# Altium integrated library PlantiumIntegratedLibrary.IntLib: 638 symbols (part 2 of 6) (continued)
## CC224CKB0402
designator C?  value 220n
220 nF ±10% 10V Ceramic Capacitor X7R 0402 (1005 Metric); Manufacturer Part Number: CGA2B1X7R1A224K050BC; Manufacturer: TDK Corporation; Working Temperature: -55°C ~ 125°C; Short Description: CAP CER 0.22UF 10V X7R 0402; Power: NC; Ratings: REACH, ROHS3, AEC-Q200; Type: MLCC; Temperature Coefficient: X7R; Mounting: SMT; Frequency: NC; Alternate Part Number 1: *; Alternate Part Number 2: *; Tolerance: ±10%; Current: NC; Revision Date: 02/08/21; Package Reference: 0402; Voltage: 10V
footprint C0402
footprint C0402_SMALL
pins: 1, 2

## CC224CKB0402_1
designator C?  value 220n
220 nF ±10% 10V Ceramic Capacitor X7R 0402 (1005 Metric); Manufacturer Part Number: CGA2B1X7R1A224K050BC; Manufacturer: TDK Corporation; Working Temperature: -55°C ~ 125°C; Short Description: CAP CER 0.22UF 10V X7R 0402; Power: NC; Ratings: REACH, ROHS3, AEC-Q200; Type: MLCC; Temperature Coefficient: X7R; Mounting: SMT; Frequency: NC; Alternate Part Number 1: *; Alternate Part Number 2: *; Tolerance: ±10%; Current: NC; Revision Date: 02/08/21; Package Reference: 0402; Voltage: 10V
footprint C0402
footprint C0402_SMALL
pins: 1, 2

## CC333HKB0402
designator C?  value 33n
0.033 µF ±10% 50V Ceramic Capacitor X7R 0402 (1005 Metric); Manufacturer Part Number: GCM155R71H333KE02D; Manufacturer: Murata Electronics; Working Temperature: -55°C ~ 125°C; Short Description: CAP CER 0.033UF 50V X7R 0402; Power: NC; Type: MLCC; Temperature Coefficient: X7R; Mounting: SMT; Ratings: *; Frequency: NC; Alternate Part Number 1: *; Alternate Part Number 2: *; Tolerance: ±10%; Current: NC; Revision Date: 05/05/23; Package Reference: 0402; Voltage: 50V
footprint C0402_SMALL_SMALL (Footprint not found)
pins: 1, 2

## CC475DMC0402W
designator C?  value 4.7u
4.7 µF ±20% 16V Ceramic Capacitor X5R 0402 (1005 Metric); Manufacturer Part Number: 0402YD475MAT2A; Manufacturer: AVX Corporation; Working Temperature: -55°C ~ 85°C; Short Description: CAP CER 4.7UF 16V X5R 0402; Power: NC; Ratings: REACH, ROHS3; Type: MLCC; Temperature Coefficient: X5R; Mounting: SMT; Frequency: NC; Alternate Part Number 1: *; Alternate Part Number 2: *; Tolerance: ±20%; Current: NC; Revision Date: 26/08/21; Package Reference: 0402; Voltage: 16V
footprint C0402 (Footprint not found)
pins: 1, 2

## Ceramico
designator C?
Power: NC; Manufacturer Part Number: *; Working Temperature: *; Temperature Coefficient: *; Mounting: SMT; Short Description: *; Ratings: *; Type: *; Frequency: NC; Alternate Part Number 1: *; Alternate Part Number 2: *; Manufacturer: *; Tolerance: *; Current: NC; Revision Date: 02/08/21; Package Reference: 0402; Voltage: *; Value: *
footprint C0402 (Footprint not found)
pins: 1, 2

## Polarizado
designator C?
Power: NC; Manufacturer Part Number: *; Working Temperature: *; Temperature Coefficient: *; Mounting: SMT; Short Description: *; Ratings: *; Type: *; Frequency: NC; Alternate Part Number 1: *; Alternate Part Number 2: *; Manufacturer: *; Tolerance: *; Current: NC; Revision Date: 02/08/21; Package Reference: 0402; Voltage: *; Value: *
footprint C0402 (Footprint not found)
pins: 1, 2


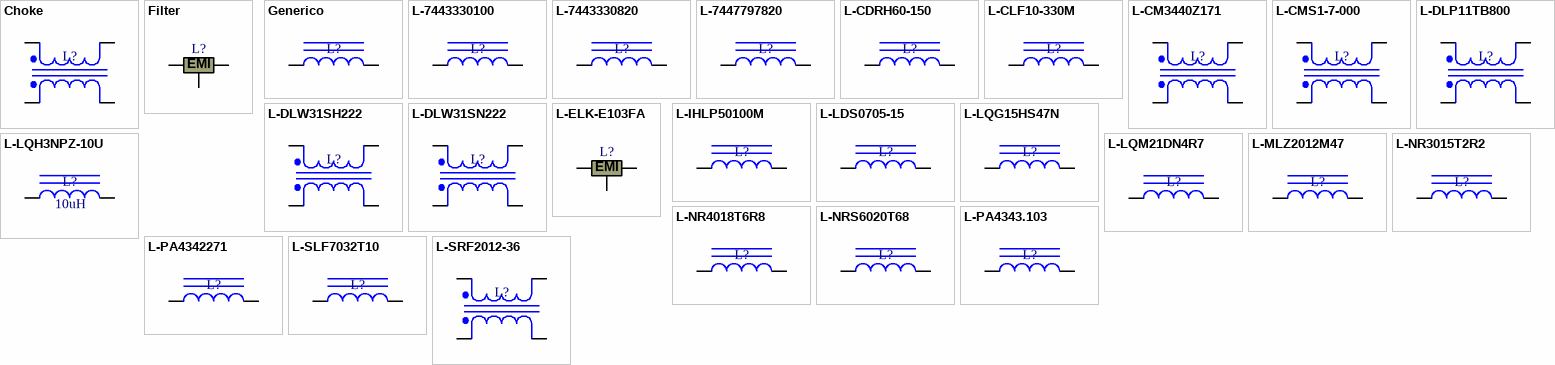
[diagram p10: symbols Choke to L-SRF2012-36]

## Choke
designator L?
Manufacturer Part Number: *; Working Temperature: *; Temperature Coefficient: *; Mounting: *; Short Description: *; Power: *; Ratings: *; Type: *; Frequency: *; Alternate Part Number 1: *; Alternate Part Number 2: *; Manufacturer: *; Tolerance: *; Current: *; Revision Date: *; Package Reference: *; Voltage: *; Value: *
pins: 1, 2, 3, 4

## Filter
designator L?
Manufacturer Part Number: *; Working Temperature: *; Temperature Coefficient: *; Mounting: *; Short Description: *; Power: *; Ratings: *; Type: *; Frequency: *; Alternate Part Number 1: *; Alternate Part Number 2: *; Manufacturer: *; Tolerance: *; Current: *; Revision Date: *; Package Reference: *; Voltage: *; Value: *
pins: 0, 1, 2
text: EMI

## Generico
designator L?
Manufacturer Part Number: *; Working Temperature: *; Temperature Coefficient: *; Mounting: *; Short Description: *; Power: *; Ratings: *; Type: *; Frequency: *; Alternate Part Number 1: *; Alternate Part Number 2: *; Manufacturer: *; Tolerance: *; Current: *; Revision Date: *; Package Reference: *; Voltage: *; Value: *
pins: 1, 2

## L-7443330100
designator L?
1 µH Shielded Wirewound Inductor 20 A 2.65mOhm Max Nonstandard; Manufacturer Part Number: 7443330100; Manufacturer: Würth Elektronik; Working Temperature: -40°C ~ 125°C; Temperature Coefficient: NC; Short Description: FIXED IND 1UH 20A 2.65 MOHM SMD; Ratings: REACH, ROHS3; Type: Fixed; Frequency: 100MHz; Tolerance: ±20%; Current: 20A; Value: 1u; Mounting: SMT; Power: NC; Alternate Part Number 2: *; Revision Date: 03/08/21; Package Reference: *; Voltage: NC
footprint 7443330100 (INDUCTOR POWER (10.90mm x 10.00mm x 9.30mm))
pins: 1, 2

## L-7443330820
designator L?
8.2 µH Shielded Wirewound Inductor 11.5 A 15mOhm Max Nonstandard; Manufacturer Part Number: 7443330820; Manufacturer: Würth Elektronik; Working Temperature: -40°C ~ 125°C; Temperature Coefficient: NC; Short Description: FIXED IND 8.2UH 11.5A 15MOHM SMD; Ratings: REACH, ROHS3; Type: Fixed; Frequency: 36MHz; Tolerance: ±20%; Current: 11.5A; Value: 8.2u; Mounting: SMT; Power: NC; Alternate Part Number 2: *; Revision Date: 03/08/21; Package Reference: *; Voltage: NC
footprint 7443330820
pins: 1, 2

## L-7447797820
designator L?
8.2 µH Shielded Wirewound Inductor 5.05 A 28.6mOhm Max Nonstandard; Manufacturer Part Number: 7447797820; Manufacturer: Würth Elektronik; Working Temperature: -40°C ~ 150°C; Temperature Coefficient: NC; Short Description: FIXED IND 8.2UH 5.05A 28.6 MOHM; Ratings: REACH, ROHS3; Type: Fixed; Frequency: 28MHz; Tolerance: ±20%; Current: 5.05A; Value: 8.2u; Mounting: SMT; Power: NC; Alternate Part Number 2: *; Revision Date: 03/08/21; Package Reference: *; Voltage: NC
footprint 7443330820
pins: 1, 2

## L-CDRH60-150
designator L?
15 µH Shielded - Inductor 2 A 76.8mOhm Nonstandard; Manufacturer Part Number: CDRH60D45BT150NP-150MC; Manufacturer: Sumida America Components Inc.; Working Temperature: -55°C ~ 150°C; Temperature Coefficient: NC; Short Description: FIXED IND 15UH 2A 76.8 MOHM SMD; Type: Fixed; Frequency: ND; Tolerance: ±20%; Current: 2A; Value: 15u; Mounting: SMT; Power: NC; Alternate Part Number 2: *; Revision Date: 25/10/21; Package Reference: *; Voltage: NC
footprint CDRH60D45BT150NP-150MC (Footprint not found)
pins: 1, 2

## L-CLF10-330M
designator L?  (value not drawn)
33 µH Shielded Drum Core, Wirewound Inductor 2.15 A 73.2mOhm Max Nonstandard; Manufacturer Part Number: CLF10060NIT-330M-D; Manufacturer: TDK Corporation; Working Temperature: -55°C ~ 150°C; Temperature Coefficient: NC; Short Description: FIXED IND 33UH 2.9A 73.2 MOHM; Ratings: REACH, ROHS3; Type: Fixed; Frequency: 10MHz; Tolerance: ±20%; Current: 2.15A; Value: 33uH; Mounting: SMT; Power: NC; Alternate Part Number 2: *; Revision Date: 03/08/21; Package Reference: *; Voltage: NC
footprint 7443330100 (INDUCTOR POWER (10.90mm x 10.00mm x 9.30mm))
pins: 1, 2

## L-CM3440Z171
designator L?
2 Line Common Mode Choke Surface Mount 170 Ohms @ 100 MHz 20A DCR 1mOhm; Manufacturer Part Number: CM3440Z171R-10; Manufacturer: Laird-Signal Integrity Products; Working Temperature: -40°C ~ 125°C; Temperature Coefficient: NC; Short Description: CMC 20A 2LN 170 OHM SMD; Ratings: REACH, ROHS3; Mounting: SMT; Power: NC; Type: Choke; Frequency: NC; Alternate Part Number 2: *; Tolerance: NC; Current: 20A; Revision Date: 03/08/21; Package Reference: *; Voltage: NC; Value: 170 Ohms @ 100 MHz
footprint CM3440Z171R-10 ((11.05mm x 8.51mm))
pins: 1, 2, 3, 4

## L-CMS1-7-000
designator L?
41.5 µH @ 100 kHz 2 Line Common Mode Choke Surface Mount 2.6A DCR 19mOhm (Typ); Manufacturer Part Number: CMS1-7-R; Working Temperature: -40°C ~ 160°C; Temperature Coefficient: NC; Short Description: CMC 41.5UH 2.6A 2LN SMD; Ratings: ROHS3; Mounting: SMT; Power: NC; Type: Choke; Frequency: NC; Alternate Part Number 2: *; Manufacturer: CMS1-7-R; Tolerance: NC; Current: 2.6A; Revision Date: 03/08/21; Package Reference: *; Voltage: NC; Value: 41.5 µH @ 100 kHz
footprint CMS1-7
pins: 1, 2, 3, 4

## L-DLP11TB800
designator L?
2 Line Common Mode Choke Surface Mount 80 Ohms @ 100 MHz 100mA DCR 1.88Ohm; Manufacturer Part Number: DLP11TB800UL2L; Manufacturer: Murata Electronics; Working Temperature: -40°C ~ 85°C; Temperature Coefficient: NC; Short Description: CMC 100MA 2LN 80 OHM SMD; Ratings: ROHS3; Mounting: SMT; Power: NC; Type: Choke; Frequency: NC; Alternate Part Number 2: *; Tolerance: NC; Current: 100mA; Revision Date: 03/08/21; Package Reference: 0504; Voltage: NC; Value: 80 Ohms @ 100 MHz
footprint DLP11TB800UL2
pins: 1, 2, 3, 4

## L-DLW31SH222
designator L?
2 Line Common Mode Choke Surface Mount 2.2 kOhms @ 100 MHz 80mA DCR 1.92Ohm; Manufacturer Part Number: DLW31SH222SQ2L; Manufacturer: Murata Electronics; Working Temperature: -40°C ~ 125°C; Temperature Coefficient: NC; Short Description: CMC 80MA 2LN 2.2KOHM SMD AECQ200; Ratings: ROHS3, AEC-Q200; Mounting: SMT; Power: NC; Type: Choke; Frequency: NC; Alternate Part Number 2: *; Tolerance: NC; Current: 80mA; Revision Date: 03/08/21; Package Reference: 1206; Voltage: NC; Value: 2.2 kOhms @ 100 MHz
footprint DLW31SH222SQ2L (Chip Common Mode Choke Coil)
pins: 1, 2, 3, 4

## L-DLW31SN222
designator L?
2 Line Common Mode Choke Surface Mount 2.2 kOhms @ 100 MHz 200mA DCR 1.2Ohm; Manufacturer Part Number: DLW31SN222SQ2L; Manufacturer: Murata Electronics; Working Temperature: -40°C ~ 85°C; Temperature Coefficient: NC; Short Description: CMC 200MA 2LN 2.2KOHM SMD; Ratings: ROHS3; Mounting: SMT; Power: NC; Type: Choke; Frequency: NC; Alternate Part Number 2: *; Tolerance: NC; Current: 200mA; Revision Date: 03/08/21; Package Reference: 1206; Voltage: NC; Value: 2.2 kOhms @ 100 MHz
footprint DLW31SH222SQ2L (Chip Common Mode Choke Coil)
pins: 1, 2, 3, 4

## L-ELK-E103FA
designator L?
LC (T-Type) EMI Filter 3rd Order Low Pass 1 Channel C = 10000pF 2 A 1207 (3218 Metric), 3 PC Pad; Manufacturer Part Number: ELK-E103FA; Manufacturer: Panasonic Electronic Components; Working Temperature: -40°C ~ 85°C; Temperature Coefficient: NC; Short Description: FILTER LC(T) 0.01UF 500KHZ SMD; Ratings: ROHS3; Current: 2A; Value: 500kHz; Mounting: SMT; Power: NC; Type: Filter; Frequency: NC; Alternate Part Number 2: *; Tolerance: NC; Revision Date: 03/08/21; Package Reference: *; Voltage: NC
footprint ELK-E103FA (DIGITAL NOISE FILTER 500KHZ SMD)
pins: 0, 1, 2
text: EMI

## L-IHLP50100M
designator L?  (value not drawn)
10 µH Shielded Molded Inductor 10 A 17.2mOhm Max Nonstandard; Manufacturer Part Number: IHLP50FDER100M01; Manufacturer: Vishay Dale; Working Temperature: -55°C ~ 125°C; Temperature Coefficient: NC; Short Description: FIXED IND 10uH 10A 17.2 MOHM SMD; Ratings: REACH, ROHS3; Type: Fixed; Frequency: 5MHz; Tolerance: ±20%; Current: 10A; Value: 10uH; Mounting: SMT; Power: NC; Alternate Part Number 2: *; Revision Date: 03/08/21; Package Reference: *; Voltage: NC
footprint IHLP5050FDER100M01 (0.520" L x 0.508" W (13.20mm x 12.90mm))
pins: 1, 2

## L-LDS0705-15
designator L?
15 µH Shielded Wirewound Inductor 2.04 A 56mOhm Nonstandard; Manufacturer Part Number: LDS0705-150M-R; Manufacturer: Eaton - Electronics Division; Working Temperature: -40°C ~ 125°C; Temperature Coefficient: NC; Short Description: FIXED IND 15UH 2.04A 56 MOHM SMD; Type: Fixed; Frequency: ND; Tolerance: ±20%; Current: 2.04A; Value: 15u; Mounting: SMT; Power: NC; Alternate Part Number 2: *; Revision Date: 03/08/21; Package Reference: *; Voltage: NC
footprint LDS0705-150M-R
pins: 1, 2

## L-LQG15HS47N
designator L?
47 nH Unshielded Multilayer Inductor 300 mA 720mOhm Max 0402 (1005 Metric); Manufacturer Part Number: LQG15HS47NJ02D; Manufacturer: Murata Electronics; Working Temperature: -55°C ~ 125°C; Temperature Coefficient: NC; Short Description: FIXED IND 47NH 300MA 720MOHM SMD; Ratings: ROHS3; Type: Fixed; Frequency: 1GHz; Tolerance: ±5%; Current: 300mA; Value: 47n; Mounting: SMT; Power: NC; Alternate Part Number 2: *; Revision Date: 03/08/21; Package Reference: 0402; Voltage: NC
footprint L0402
pins: 1, 2

## L-LQH3NPZ-10U
designator L?  value 10uH
10 µH Shielded Drum Core, Wirewound Inductor 1.2 A 288mOhm Max 1212 (3030 Metric); Manufacturer Part Number: LQH3NPZ100MJRL; Manufacturer: Murata Electronics; Working Temperature: -40°C ~ 105°C; Temperature Coefficient: NC; Short Description: FIXED IND 10UH 1.2A 288 MOHM SMD; Ratings: AEC-Q200, ROHS3; Type: Fixed; Frequency: 30MHz; Tolerance: ±20%; Current: 1.2A; Mounting: SMT; Power: NC; Alternate Part Number 2: *; Revision Date: 18/04/23; Package Reference: *; Voltage: NC
footprint NR3015T2R2M
pins: 1, 2

## L-LQM21DN4R7
designator L?
4.7 µH Shielded Multilayer Inductor 30 mA 300mOhm Max 0805 (2012 Metric); Manufacturer Part Number: LQM21DN4R7N00D; Manufacturer: Murata Electronics; Working Temperature: -40°C ~ 85°C; Temperature Coefficient: NC; Short Description: FIXED IND 4.7UH 30MA 300MOHM SMD; Ratings: ROHS3; Type: Fixed; Frequency: 35MHz; Tolerance: ±30%; Current: 30mA; Value: 4.7u; Mounting: SMT; Power: NC; Alternate Part Number 2: *; Revision Date: 03/08/21; Package Reference: 0805; Voltage: NC
footprint LQM21DN4R7N00D
pins: 1, 2

## L-MLZ2012M47
designator L?
47 µH Shielded Multilayer Inductor 170 mA 3.7Ohm 0805 (2012 Metric); Manufacturer Part Number: MLZ2012M470WT000; Manufacturer: TDK Corporation; Working Temperature: -55°C ~ 125°C; Temperature Coefficient: NC; Short Description: FIXED IND 47UH 170MA 3.7 OHM SMD; Ratings: REACH, ROHS3; Type: Fixed; Frequency: 20MHz; Tolerance: ±20%; Current: 170mA; Value: 47u; Mounting: SMT; Power: NC; Alternate Part Number 2: *; Revision Date: 03/08/21; Package Reference: 0805; Voltage: NC
footprint L0805
pins: 1, 2

## L-NR3015T2R2
designator L?
2.2 µH Shielded Wirewound Inductor 1.5 A 72mOhm Max Nonstandard; Manufacturer Part Number: NR3015T2R2M; Manufacturer: Taiyo Yuden; Working Temperature: -25°C ~ 120°C; Temperature Coefficient: NC; Short Description: FIXED IND 2.2UH 1.5A 72 MOHM SMD; Ratings: ROHS3; Type: Fixed; Frequency: 64MHz; Tolerance: ±20%; Current: 1.5A; Value: 2.2u; Mounting: SMT; Power: NC; Alternate Part Number 2: *; Revision Date: 03/08/21; Package Reference: *; Voltage: NC
footprint NR3015T2R2M
pins: 1, 2

## L-NR4018T6R8
designator L?
6.8 µH Shielded Wirewound Inductor 1.06 A 132mOhm Max Nonstandard; Manufacturer Part Number: NR4018T6R8M; Manufacturer: Taiyo Yuden; Working Temperature: -25°C ~ 120°C; Temperature Coefficient: NC; Short Description: FIXED IND 6.8UH 1.06A 132MOHM SM; Ratings: ROHS3; Type: Fixed; Frequency: 29MHz; Tolerance: ±20%; Current: 1.06A; Value: 6.8u; Mounting: SMT; Power: NC; Alternate Part Number 2: *; Revision Date: 03/08/21; Package Reference: *; Voltage: NC
footprint NR4018T6R8M (FIXED IND 6.8UH 1(4.00mm x 4.00mm x 2.00mm))
pins: 1, 2

## L-NRS6020T68
designator L?
6.8 µH Shielded Wirewound Inductor 1.8 A 102mOhm Max Nonstandard; Manufacturer Part Number: NRS6020T6R8NMGJ; Manufacturer: Taiyo Yuden; Working Temperature: -25°C ~ 125°C; Temperature Coefficient: NC; Short Description: FIXED IND 6.8UH 1.8A 102MOHM SMD; Ratings: ROHS3; Type: Fixed; Frequency: 30MHz; Tolerance: ±30%; Current: 1.8A; Value: 6.8u; Mounting: SMT; Power: NC; Alternate Part Number 2: *; Revision Date: 03/08/21; Package Reference: *; Voltage: NC
footprint NRS6020T6R8NMGJ (INDUCTOR 10UH 1.3A 20% SMD)
pins: 1, 2

## L-PA4343.103
designator L?
10 µH Shielded Molded Inductor 11 A 15.8mOhm Max Nonstandard -; Manufacturer Part Number: PA4343.103ANLT; Manufacturer: Pulse Electronics Power; Working Temperature: -55°C ~ 155°C; Temperature Coefficient: NC; Short Description: FIXED IND 10UH 11A 15.8 MOHM SMD; Ratings: REACH, ROHS3, AEC-Q200; Type: Fixed; Frequency: ND; Tolerance: ±20%; Current: 11A; Value: 10u; Mounting: SMT; Power: NC; Alternate Part Number 2: *; Revision Date: 20/09/21; Package Reference: *; Voltage: NC
footprint PA4343.103ANLT (Footprint not found)
pins: 1, 2

## L-PA4342271
designator L?
270nH Shielded Molded Inductor 1mOhm; Manufacturer Part Number: PA4342.271NLT; Manufacturer: Pulse Electronics Power; Working Temperature: -40°C ~ 125°C; Temperature Coefficient: NC; Short Description: FIXED IND 270NH 33A 1 MOHM SMD; Ratings: REACH, ROHS; Type: Fixed; Frequency: 100 kHz; Tolerance: ±20%; Current: 33A; Value: 270n; Mounting: SMT; Power: NC; Alternate Part Number 1: *; Alternate Part Number 2: *; Revision Date: 02/09/21; Package Reference: NC; Voltage: NC
footprint PA4342
pins: 1, 2

## L-SLF7032T10
designator L?
100 µH Shielded Wirewound Inductor 450 mA 540mOhm Max Nonstandard; Manufacturer Part Number: SLF7032T-101MR45-2PF; Manufacturer: TDK Corporation; Working Temperature: -40°C ~ 105°C; Temperature Coefficient: NC; Short Description: FIXED IND 100UH 450MA 540MOHM SM; Ratings: REACH, ROHS3; Type: Fixed; Frequency: ND; Tolerance: ±20%; Current: 450mA; Value: 100u; Mounting: SMT; Power: NC; Alternate Part Number 2: *; Revision Date: 03/08/21; Package Reference: *; Voltage: NC
footprint SLF7032T-101MR45-2-PF
pins: 1, 2

## L-SRF2012-36
designator L?
2 Line Common Mode Choke Surface Mount 360 Ohms @ 100 MHz 300mA DCR 450mOhm; Manufacturer Part Number: SRF2012-361YA; Manufacturer: Bourns Inc.; Working Temperature: -40°C ~ 125°C; Temperature Coefficient: NC; Short Description: CMC 300MA 2LN 360 OHM SMD; Ratings: REACH, ROHS3; Mounting: SMT; Power: NC; Type: Choke; Frequency: NC; Alternate Part Number 2: *; Tolerance: NC; Current: 300mA; Revision Date: 03/08/21; Package Reference: *; Voltage: NC; Value: 360 Ohms @ 100 MHz
footprint SRF2012-361 (CHOKE COMM MODE 90 OHM .4A SMD)
pins: 1, 2, 3, 4


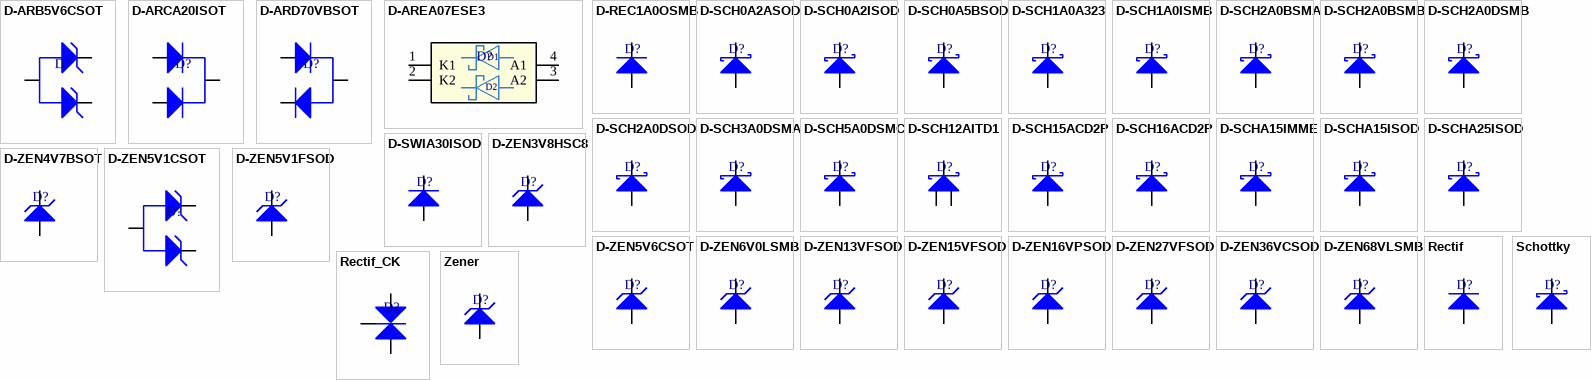
[diagram p11: symbols D-ARB5V6CSOT to Zener]

## D-ARB5V6CSOT
designator D?
Zener Diode Array 1 Pair Common Anode 5.6 V 300 mW ±2% TO-236AB; Manufacturer Part Number: BZB84-B5V6,215; Manufacturer: Nexperia USA Inc.; Working Temperature: -55°C ~ 150°C (TA); Temperature Coefficient: NC; Short Description: DIODE ZENER ARRAY 5.6V SOT23; Power: 300mW; Ratings: REACH, ROHS3; Current: 1 µA @ 2 V; Voltage: 900 mV @ 10 mA; Value: 5.6; Mounting: SMT; Type: Zener; Frequency: NC; Alternate Part Number 2: *; Tolerance: ±2%; Revision Date: 03/08/21; Package Reference: SOT-23-3
footprint SOT-23-3
pins: 1 K, 2 K, 3 A

## D-ARCA20ISOT
designator D?
Diode Array 1 Pair Common Cathode Standard 100 V 215mA (DC) Surface Mount TO-236-3, SC-59, SOT-23-3; Manufacturer Part Number: BAV70; Manufacturer: Rectron USA; Working Temperature: -55°C ~ 150°C; Temperature Coefficient: NC; Short Description: DUAL SWITCHING DIODE COM CATHOD; Ratings: ROHS3; Type: Rectifier; Voltage: 100V; Value: NC; Mounting: SMT; Power: NC; Frequency: NC; Alternate Part Number 2: *; Tolerance: NC; Current: 215mA; Revision Date: 03/08/21; Package Reference: SOT-23-3
footprint SOT-23-3
pins: 1 A, 2 A, 3 K

## D-ARD70VBSOT
designator D?
Diode Array 1 Pair Series Connection 70 V 215mA (DC) Surface Mount TO-236-3, SC-59, SOT-23-3; Manufacturer Part Number: BAV199LT1G; Alternate Part Number 2: CADA DIODO; Manufacturer: onsemi; Working Temperature: -65°C ~ 150°C; Temperature Coefficient: NC; Short Description: DIODE ARRAY GP 70V 215MA SOT23-3; Power: 225mW; Ratings: ROHS3; Voltage: 70V; Value: NC; Mounting: SMT; Type: NC; Frequency: NC; Tolerance: NC; Current: 215mA; Revision Date: 23/04/23; Package Reference: SOT-23-3
footprint SOT-23-3
pins: 1 A, 2 K, 3 C

## D-AREA07ESE3
designator D?, comment BAS70-07,215  (value not drawn)
Diode Array 2 Independent Schottky 70 V 70mA (DC) Surface Mount TO-253-4, TO-253AA; Manufacturer: Nexperia USA Inc.; Frequency: NC; Short Description: DIODE ARRAY SCHOTTKY 70V SOT143B; Ratings: ROHS3; Type: SCH; Working Temperature: 150°C (Max); Voltage: 70 V; Value: NC; Manufacturer Part Number: BAS70-07,215; Temperature Coefficient: NC; Mounting: SMT; Power: NC; Alternate Part Number 1: *; Alternate Part Number 2: *; Tolerance: NC; Current: 70 mA; Revision Date: 30/09/22; Package Reference: TO-253-4, TO-253AA
footprint SOT143B_NXP
footprint SOT143B_NXP-L
footprint SOT143B_NXP-M
pins: 1 K1, 2 K2, 3 A2, 4 A1
text: D1; D2

## D-REC1A0OSMB
designator D?
Diode Standard 400 V 1A Surface Mount SMB; Manufacturer Part Number: S1GB-13-F; Manufacturer: Diodes Incorporated; Working Temperature: -65°C ~ 150°C; Temperature Coefficient: NC; Short Description: DIODE GEN PURP 400V 1A SMB; Ratings: REACH, ROHS3; Type: Rectifier; Voltage: 400V; Value: NC; Mounting: SMT; Power: NC; Frequency: NC; Alternate Part Number 1: *; Alternate Part Number 2: *; Tolerance: NC; Current: 1A; Revision Date: 03/08/21; Package Reference: DO-214AA
footprint DO-214AA
pins: 1 K, 2 A

## D-SCH0A2ASOD
designator D?
Diode Schottky 30 V 200mA (DC) Surface Mount SOD-123; Manufacturer Part Number: BAT43W-HE3-08; Manufacturer: Vishay; Frequency: NC; Short Description: DIODE SCHOTTKY 30V 200MA SOD123; Power: 200mW; Ratings: REACH, ROHS3; Type: SCH; Working Temperature: 125°C (Max); Voltage: 30V; Value: NC; Temperature Coefficient: NC; Mounting: SMT; Alternate Part Number 1: *; Alternate Part Number 2: *; Tolerance: NC; Current: 200mA; Revision Date: 24/11/21; Package Reference: SOD-123
footprint SOD-123
pins: 1 K, 2 A

## D-SCH0A2ISOD
designator D?
Diode Schottky 100 V 200mA (DC) Surface Mount SOD-123; Manufacturer Part Number: BAT41ZFILM; Manufacturer: STMicroelectronics; Working Temperature: 150°C (Max); Temperature Coefficient: NC; Short Description: DIODE SCHOTTKY 100V 200MA SOD123; Ratings: REACH, ROHS3; Type: SCH; Voltage: 100V; Value: NC; Mounting: SMT; Power: NC; Frequency: NC; Alternate Part Number 2: *; Tolerance: NC; Current: 200mA; Revision Date: 03/08/21; Package Reference: SOD-123
footprint SOD-123
pins: 1 K, 2 A

## D-SCH0A5BSOD
designator D?
Diode Schottky 40 V 500mA Surface Mount SOD-123; Manufacturer Part Number: MBR0540T1G; Manufacturer: ON Semiconductor; Working Temperature: -55°C ~ 150°C; Temperature Coefficient: NC; Short Description: DIODE SCHOTTKY 40V 500MA SOD123; Ratings: REACH, ROHS3; Type: SCH; Voltage: 40V; Value: NC; Mounting: SMT; Power: NC; Frequency: NC; Alternate Part Number 2: *; Tolerance: NC; Current: 500mA; Revision Date: 03/08/21; Package Reference: SOD-123
footprint SOD-123
pins: 1 K, 2 A

## D-SCH1A0A323
designator D?
Diode Schottky 30 V 1A Surface Mount USC; Manufacturer Part Number: CUS10S30,H3F; Manufacturer: Toshiba Semiconductor and Storage; Working Temperature: 125°C (Max); Temperature Coefficient: NC; Short Description: DIODE SCHOTTKY 30V 1A USC; Ratings: ROHS3; Type: SCH; Voltage: 30V; Value: NC; Mounting: SMT; Power: NC; Frequency: NC; Alternate Part Number 2: *; Tolerance: NC; Current: 1A; Revision Date: 03/08/21; Package Reference: SOD-323
footprint SOD-323
pins: 1 K, 2 A

## D-SCH1A0ISMB
designator D?
Diode Schottky 100 V 1A Surface Mount DO-214AC (SMA); Manufacturer Part Number: VS-10MQ100NTRPBF; Manufacturer: Vishay General Semiconductor - Diodes Division; Working Temperature: -55°C ~ 150°C; Temperature Coefficient: NC; Short Description: DIODE SCHOTTKY 100V 1A SMA; Ratings: REACH, ROHS3; Type: SCH; Voltage: 100V; Value: NC; Mounting: SMT; Power: NC; Frequency: NC; Alternate Part Number 2: *; Tolerance: NC; Current: 1A; Revision Date: 03/08/21; Package Reference: DO-214AC
footprint DO-214AC-SMALL (Manufacturer: Vishay)
pins: 1 K, 2 A

## D-SCH2A0BSMA
designator D?
Diode Schottky 2A Surface Mount DO-214AC (SMA); Manufacturer Part Number: CD214A-B240LLF; Manufacturer: Bourns Inc.; Working Temperature: -55°C ~ 125°C; Temperature Coefficient: NC; Short Description: DIODE SCHOTTKY 40V 2A SMA; Ratings: REACH, ROHS3; Type: SCH; Voltage: 40V; Value: NC; Mounting: SMT; Power: NC; Frequency: NC; Alternate Part Number 2: *; Tolerance: NC; Current: 2A; Revision Date: 03/08/21; Package Reference: DO-214AC
footprint DO-214AC-BIG (Manufacturer: BOURNS)
pins: 1 K, 2 A

## D-SCH2A0BSMB
designator D?
Diode Schottky 40 V 2A Surface Mount SMB; Manufacturer Part Number: STPS2L40U; Manufacturer: STMicroelectronics; Working Temperature: 150°C (Max); Temperature Coefficient: NC; Short Description: DIODE SCHOTTKY 40V 2A SMB; Ratings: REACH, ROHS3; Type: SCH; Voltage: 40V; Value: NC; Mounting: SMT; Power: NC; Frequency: NC; Alternate Part Number 2: *; Tolerance: NC; Current: 2A; Revision Date: 03/08/21; Package Reference: DO-214AA
footprint DO-214AA
pins: 1 K, 2 A

## D-SCH2A0DSMB
designator D?
Diode Schottky 60 V 2A Surface Mount SMBflat; Manufacturer Part Number: STPS2L60UF; Manufacturer: STMicroelectronics; Working Temperature: 150°C (Max); Temperature Coefficient: NC; Short Description: DIODE SCHOTTKY 60V 2A SMBFLAT; Ratings: REACH, ROHS3; Type: SCH; Voltage: 60V; Value: NC; Mounting: SMT; Power: NC; Frequency: NC; Alternate Part Number 2: *; Tolerance: NC; Current: 2A; Revision Date: 03/08/21; Package Reference: DO-221AA
footprint DO-221AA
pins: 1 K, 2 A

## D-SCH2A0DSOD
designator D?
Diode Schottky 60 V 2A Surface Mount PMDU; Manufacturer Part Number: RB060M-60TR; Manufacturer: Rohm Semiconductor; Working Temperature: 150°C (Max); Temperature Coefficient: NC; Short Description: DIODE SCHOTTKY 60V 2A PMDU; Ratings: ROHS3; Type: SCH; Voltage: 60V; Value: NC; Mounting: SMT; Power: NC; Frequency: NC; Alternate Part Number 2: *; Tolerance: NC; Current: 2A; Revision Date: 03/08/21; Package Reference: SOD-123F
footprint SOD-123F
pins: 1 K, 2 A

## D-SCH3A0DSMA
designator D?  (value not drawn)
Diode Schottky 60 V 3A Surface Mount SMA; Manufacturer Part Number: B360A-13-F; Manufacturer: Diodes Incorporated; Working Temperature: -55°C ~ 150°C; Temperature Coefficient: NC; Short Description: DIODE SCHOTTKY 60V 3A SMA; Ratings: REACH, ROHS3; Type: SCH; Voltage: 60V; Value: NC; Mounting: SMT; Power: NC; Frequency: NC; Alternate Part Number 2: *; Tolerance: NC; Current: 3A; Revision Date: 03/08/21; Package Reference: DO-214AC
footprint DO-214AC-BIG (Manufacturer: BOURNS)
pins: 1 K, 2 A

## D-SCH5A0DSMC
designator D?
Diode Schottky 60 V 5A Surface Mount SMC; Manufacturer Part Number: B560C-13-F; Manufacturer: Diodes Incorporated; Working Temperature: -55°C ~ 150°C; Temperature Coefficient: NC; Short Description: DIODE SCHOTTKY 60V 5A SMC; Ratings: ROHS3; Type: SCH; Voltage: 60V; Value: NC; Mounting: SMT; Power: NC; Frequency: NC; Alternate Part Number 2: *; Tolerance: NC; Current: 5A; Revision Date: 03/08/21; Package Reference: DO-214AB
footprint DO-214AB
pins: 1 K, 2 A

## D-SCH12AITD1
designator D?
Diode Schottky 100 V 12A Surface Mount TO-277-3; Manufacturer Part Number: FSV12100V; Manufacturer: onsemi; Working Temperature: -55°C ~ 150°C; Temperature Coefficient: NC; Short Description: DIODE SCHOTTKY 100V 12A TO277-3; Ratings: REACH, ROHS3; Type: SCH; Voltage: 100V; Value: NC; Mounting: SMT; Power: NC; Frequency: NC; Alternate Part Number 2: *; Tolerance: NC; Current: 12A; Revision Date: 20/09/21; Package Reference: TO277-3
footprint TO-227-3
pins: 1 A1, 2 A2, 3 K

## D-SCH15ACD2P
designator D?  (value not drawn)
Diode 30 V 15A Surface Mount DDPAK/TO-263-3; Manufacturer Part Number: SM74611KTTR; Manufacturer: Texas Instruments; Working Temperature: -65°C ~ 175°C; Temperature Coefficient: NC; Short Description: DIODE GP 30V 15A DDPAK/TO-263-3; Ratings: REACH, ROHS3; Type: SCH; Voltage: 30V; Vf: 26mV@8A; Mounting: SMT; Power: NC; Frequency: NC; Alternate Part Number 2: *; Tolerance: NC; Current: 15A; Revision Date: 20/09/21; Package Reference: TO-263-3, D²Pak (2 Leads + Tab), TO-263AB
footprint D2PAK (D2-PAK/TO-263-AB; 3 Leads (1 Cropped); Body 15.5 (inc. leads) x 10.5 mm (LxW max))
pins: 1 A2, 2 K, 3 A1

## D-SCH16ACD2P
designator D?  (value not drawn)
Diode Schottky 45 V 16A Surface Mount D²PAK; Manufacturer Part Number: MBRB1645T4G; Manufacturer: onsemi; Working Temperature: -65°C ~ 175°C; Temperature Coefficient: NC; Short Description: DIODE SCHOTTKY 45V 16A D2PAK; Ratings: REACH, ROHS3; Type: SCH; Voltage: 45V; Value: NC; Mounting: SMT; Power: NC; Frequency: NC; Alternate Part Number 2: *; Tolerance: NC; Current: 16a; Revision Date: 20/09/21; Package Reference: TO-263-3, D²Pak (2 Leads + Tab), TO-263AB
footprint D2PAK (D2-PAK/TO-263-AB; 3 Leads (1 Cropped); Body 15.5 (inc. leads) x 10.5 mm (LxW max))
pins: 1 A2, 2 K, 3 A1

## D-SCHA15IMME
designator D?
Diode Schottky 100 V 150mA (DC) Surface Mount Mini MELF; Manufacturer Part Number: TMMBAT46FILM; Manufacturer: STMicroelectronics; Working Temperature: -65°C ~ 125°C; Temperature Coefficient: NC; Short Description: DIODE SCHOTTKY 100V 150MA MINMLF; Ratings: REACH, ROHS3; Type: SCH; Voltage: 100V; Value: NC; Mounting: SMT; Power: NC; Frequency: NC; Alternate Part Number 2: *; Tolerance: NC; Current: 150mA; Revision Date: 03/08/21; Package Reference: DO-213AA
footprint DO-213AA
pins: 1 K, 2 A

## D-SCHA15ISOD
designator D?
Diode Schottky 100 V 150mA (DC) Surface Mount SOD-123; Manufacturer Part Number: BAT46ZFILM; Manufacturer: STMicroelectronics; Working Temperature: -65°C ~ 125°C; Temperature Coefficient: NC; Short Description: DIODE SCHOTTKY 100V 150MA SOD123; Ratings: REACH, ROHS3; Type: SCH; Voltage: 100V; Value: NC; Mounting: SMT; Power: NC; Frequency: NC; Alternate Part Number 2: *; Tolerance: NC; Current: 150mA; Revision Date: 23/08/21; Package Reference: SOD-123
footprint SOD-123
pins: 1 K, 2 A

## D-SCHA25ISOD
designator D?
Diode Schottky 100 V 250mA Surface Mount SOD-123; Manufacturer Part Number: BAT46GWJ; Manufacturer: Nexperia USA Inc.; Working Temperature: -55°C ~ 150°C; Temperature Coefficient: NC; Short Description: DIODE SCHOTTKY 100V 250MA SOD123; Ratings: REACH, ROHS3, AEC-Q101; Type: SCH; Voltage: 100V; Value: NC; Mounting: SMT; Power: NC; Frequency: NC; Alternate Part Number 1: *; Alternate Part Number 2: *; Tolerance: NC; Current: 250mA; Revision Date: 14/06/23; Package Reference: SOD-123; ComponentLink1Description: Datasheet; ComponentLink1URL: https://assets.nexperia.com/documents/data-sheet/BAT46GW.pdf
footprint SOD-123
pins: 1 K, 2 A

## D-SWIA30ISOD
designator D?
Diode Standard 100 V 150mA Surface Mount SOD-123; Manufacturer Part Number: 1N4148W-7-F; Manufacturer: Diodes Incorporated; Working Temperature: -65°C ~ 150°C; Temperature Coefficient: NC; Short Description: DIODE GEN PURP 100V 150MA SOD123; Ratings: REACH, ROHS3; Type: Rectifier; Voltage: 100V; Value: NC; Mounting: SMT; Power: NC; Frequency: NC; Alternate Part Number 2: *; Tolerance: NC; Current: 150mA; Revision Date: 03/08/21; Package Reference: SOD-123
footprint SOD-123
pins: 1 K, 2 A

## D-ZEN3V8HSC8
designator D?
Zener Diode 3.8 V 1 W ±5.26% Surface Mount PMDTM; Manufacturer Part Number: PDZVTR3.6B; Manufacturer: Rohm Semiconductor; Frequency: NC; Short Description: DIODE ZENER 3.8V 1W PMDTM; Power: 1W; Ratings: ROHS3; Working Temperature: 150°C (TJ); Current: ND; Voltage: 750mV @ 20mA; Value: 3.8V; Temperature Coefficient: NC; Mounting: SMT; Type: Zener; Alternate Part Number 1: *; Alternate Part Number 2: *; Tolerance: ±5.26%; Revision Date: 02/09/21; Package Reference: SOD-128
footprint SOD-128
pins: 1 K, 2 A

## D-ZEN4V7BSOT
designator D?
Zener Diode 4.7 V 225 mW ±6% Surface Mount SOT-23-3 (TO-236); Manufacturer Part Number: BZX84C4V7LT1G; Manufacturer: onsemi; Short Description: DIODE ZENER 4.7V 250MW SOT23-3; Power: 250 mW; Ratings: ROHS3, REACH, EAR99; Working Temperature: -65°C ~ 150°C (TJ); Current: 3 µA @ 2 V; Voltage: 900 mV @ 10 mA; Value: 4.7 V; Frequency: *; Temperature Coefficient: *; Mounting: SMD; Type: Zener; Alternate Part Number 1: *; Alternate Part Number 2: *; Tolerance: ±6%; Revision Date: 23/06/2023; Package Reference: SOT-23-3; ComponentLink1Description: Datasheet; ComponentLink1URL: https://www.onsemi.com/pdf/datasheet/bzx84c2v4lt1-d.pdf
footprint SOT-23-3
pins: 1 A, 3 K

## D-ZEN5V1CSOT
designator D?
Zener Diode Array 1 Pair Common Anode 5.1 V 300 mW ±2% TO-236AB; Manufacturer Part Number: BZB84-B5V1,215; Manufacturer: Nexperia USA Inc.; Working Temperature: ND; Temperature Coefficient: NC; Short Description: DIODE ZENER ARRAY 5.1V SOT23; Power: 300mW; Ratings: REACH, ROHS3; Current: 2 µA @ 2 V; Voltage: 900 mV @ 10 mA; Value: 5.1; Mounting: SMT; Type: Zener; Frequency: NC; Alternate Part Number 2: *; Tolerance: ±2%; Revision Date: 03/08/21; Package Reference: SOT-23-3
footprint SOT-23-3
pins: 1 K, 2 K, 3 A

## D-ZEN5V1FSOD
designator D?
Zener Diode 5.1 V 500 mW ±5% Surface Mount SOD-123; Manufacturer Part Number: MMSZ5231B-7-F; Manufacturer: Diodes Incorporated; Working Temperature: -65°C ~ 150°C; Temperature Coefficient: NC; Short Description: DIODE ZENER 5.1V 500MW SOD123; Power: 500mW; Ratings: REACH, ROHS3; Current: 5 µA @ 2 V; Voltage: 900 mV @ 10 mA; Value: 5.1; Mounting: SMT; Type: Zener; Frequency: NC; Alternate Part Number 2: *; Tolerance: ±5%; Revision Date: 15/03/22; Package Reference: SOD-123
footprint SOD-123
pins: 1 K, 2 A

## D-ZEN5V6CSOT
designator D?
Zener Diode 5.6 V 350 mW ±7% Surface Mount SOT-23-3; Manufacturer Part Number: BZX84C5V6; Manufacturer: ON Semiconductor; Working Temperature: -55°C ~ 150°C; Temperature Coefficient: NC; Short Description: DIODE ZENER 5.6V 350MW SOT23-3; Power: 350mW; Ratings: REACH; Current: 1 µA @ 2 V; Voltage: 900 mV @ 10 mA; Value: 5.6; Mounting: SMT; Type: Zener; Frequency: NC; Alternate Part Number 2: *; Tolerance: ±7%; Revision Date: 03/08/21; Package Reference: SOT-23-3
footprint SOT-23-3
pins: 1 A, 3 K

## D-ZEN6V0LSMB
designator D?  (value not drawn)
Zener Diode 6 V 5 W ±5% Surface Mount DO-214AA (SMB); Manufacturer Part Number: CZRB5340B-HF; Manufacturer: Comchip Technology; Working Temperature: -55°C ~ 150°C; Temperature Coefficient: NC; Short Description: DIODE ZENER 6V 5W DO214AA; Power: 5 W; Ratings: REACH, ROHS3; Current: 1 µA @ 3 V; Voltage: 1.2 V @ 200 mA; Value: 6 V; Mounting: SMT; Type: Zener; Frequency: NC; Alternate Part Number 2: *; Tolerance: ±5%; Revision Date: 03/08/21; Package Reference: DO-214AA
footprint DO-214AA
pins: 1 K, 2 A

## D-ZEN13VFSOD
designator D?
Zener Diode 13 V 500 mW ±6% Surface Mount SOD-123; Manufacturer Part Number: MMSZ13T1G; Manufacturer: onsemi; Working Temperature: -55°C ~ 150°C; Temperature Coefficient: NC; Short Description: DIODE ZENER 13V 500MW SOD123; Power: 500mW; Ratings: REACH, ROHS3; Current: 100 nA @ 10.5 V; Voltage: 900 mV @ 10 mA; Value: 13; Mounting: SMT; Type: Zener; Frequency: NC; Alternate Part Number 2: *; Tolerance: ±6%; Revision Date: 04/08/22; Package Reference: SOD-123
footprint SOD-123
pins: 1 K, 2 A

## D-ZEN15VFSOD
designator D?
Zener Diode 15 V 500 mW ±6% Surface Mount SOD-123; Manufacturer Part Number: BZT52C15-7-F; Manufacturer: Diodes Incorporated; Working Temperature: -65°C ~ 150°C; Temperature Coefficient: NC; Short Description: DIODE ZENER 15V 500MW SOD123; Power: 500mW; Ratings: REACH, ROHS3; Current: 100 nA @ 10.5 V; Voltage: 900 mV @ 10 mA; Value: 15; Mounting: SMT; Type: Zener; Frequency: NC; Alternate Part Number 2: *; Tolerance: ±6%; Revision Date: 03/08/21; Package Reference: SOD-123
footprint SOD-123
pins: 1 K, 2 A

## D-ZEN16VPSOD
designator D?
Zener Diode 16 V 590 mW ±1.88% Surface Mount SOD-123; Manufacturer Part Number: BZT52-B16J; Manufacturer: Nexperia USA Inc.; Working Temperature: -55°C ~ 150°C (TA); Temperature Coefficient: NC; Short Description: DIODE ZENER 16V 590MW SOD123; Power: 590mW; Ratings: REACH, ROHS3; Current: 50 nA @ 11.2 V; Voltage: 900 mV @ 10 mA; Value: 16; Mounting: SMT; Type: Zener; Frequency: NC; Alternate Part Number 2: *; Tolerance: ±1.88%; Revision Date: 03/08/21; Package Reference: SOD-123
footprint SOD-123
pins: 1 K, 2 A

## D-ZEN27VFSOD
designator D?
Zener Diode 27 V 500 mW ±5% Surface Mount SOD-123; Manufacturer Part Number: MMSZ4711T1G; Manufacturer: onsemi; Working Temperature: -55°C ~ 150°C; Temperature Coefficient: NC; Short Description: DIODE ZENER 27V 500MW SOD123; Power: 500mW; Ratings: REACH, ROHS3; Tolerance: ±6%; Current: 10 nA @ 20.4 V; Voltage: 900 mV @ 10 mA; Value: 27; Mounting: SMT; Type: Zener; Frequency: NC; Alternate Part Number 2: *; Revision Date: 04/08/22; Package Reference: SOD-123
footprint SOD-123
pins: 1 K, 2 A

## D-ZEN36VCSOD
designator D?
Zener Diode 36 V 310 mW ±2.5% Surface Mount SOD-123; Manufacturer Part Number: DDZ36-7; Manufacturer: Diodes Incorporated; Working Temperature: -65°C ~ 150°C; Temperature Coefficient: NC; Short Description: DIODE ZENER 36V 310MW SOD123; Power: 310mW; Ratings: REACH, ROHS3; Current: 50 nA @ 30 V; Voltage: 900 mV @ 10 mA; Value: 36; Mounting: SMT; Type: Zener; Frequency: NC; Alternate Part Number 2: *; Tolerance: ±2.5%; Revision Date: 03/08/21; Package Reference: SOD-123
footprint SOD-123
pins: 1 K, 2 A

## D-ZEN68VLSMB
designator D?
Zener Diode 68 V 3 W ±5% Surface Mount SMB; Manufacturer Part Number: 1SMB5945BT3G; Manufacturer: ON Semiconductor; Working Temperature: -65°C ~ 150°C; Temperature Coefficient: NC; Short Description: DIODE ZENER 68V 3W SMB; Power: 3W; Ratings: REACH, ROHS3; Current: 1 µA @ 51.7 V; Voltage: 1.5 V @ 200 mA; Value: 68; Mounting: SMT; Type: Zener; Frequency: NC; Alternate Part Number 2: *; Tolerance: ±5%; Revision Date: 03/08/21; Package Reference: DO-214AA
footprint DO-214AA
pins: 1 K, 2 A

## Rectif
designator D?
Manufacturer Part Number: *; Frequency: *; Temperature Coefficient: *; Mounting: *; Short Description: *; Power: *; Ratings: *; Type: *; Working Temperature: *; Alternate Part Number 1: *; Alternate Part Number 2: *; Manufacturer: *; Tolerance: *; Current: *; Revision Date: *; Package Reference: *; Voltage: *; Value: *
pins: 1 K, 2 A

## Rectif_CK
designator D?
Manufacturer Part Number: *; Frequency: *; Temperature Coefficient: *; Mounting: *; Short Description: *; Power: *; Ratings: *; Type: *; Working Temperature: *; Alternate Part Number 1: *; Alternate Part Number 2: *; Manufacturer: *; Tolerance: *; Current: *; Revision Date: *; Package Reference: *; Voltage: *; Value: *
pins: 1 A, 2 A, 3 K

## Schottky
designator D?
Manufacturer Part Number: *; Frequency: *; Temperature Coefficient: *; Mounting: *; Short Description: *; Power: *; Ratings: *; Type: *; Working Temperature: *; Alternate Part Number 1: *; Alternate Part Number 2: *; Manufacturer: *; Tolerance: *; Current: *; Revision Date: *; Package Reference: *; Voltage: *; Value: *
pins: 1 K, 2 A

## Zener
designator D?
Manufacturer Part Number: *; Frequency: *; Temperature Coefficient: *; Mounting: *; Short Description: *; Power: *; Ratings: *; Type: *; Working Temperature: *; Alternate Part Number 1: *; Alternate Part Number 2: *; Manufacturer: *; Tolerance: *; Current: *; Revision Date: *; Package Reference: *; Voltage: *; Value: *
pins: 1 K, 2 A


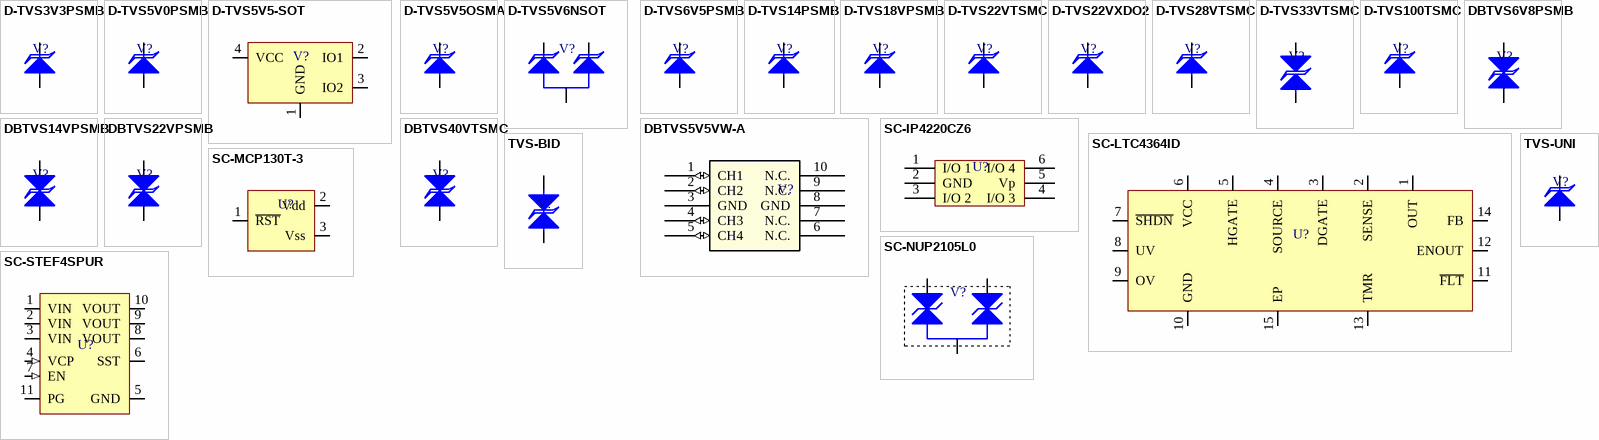
[diagram p12: symbols D-TVS3V3PSMB to TVS-UNI]

## D-TVS3V3PSMB
designator V?
10.3V Clamp 200A (8/20µs) Ipp Tvs Diode Surface Mount SMB (DO-214AA); Manufacturer Part Number: SMLVT3V3; Manufacturer: STMicroelectronics; Working Temperature: -25°C ~ 175°C (TJ); Temperature Coefficient: NC; Short Description: TVS DIODE 3.3VWM 10.3VC SMB; Power: 600W; Ratings: REACH, ROHS3; Value: 3.3V; Mounting: SMT; Type: TVS; Frequency: *; Alternate Part Number 1: *; Alternate Part Number 2: *; Tolerance: NC; Current: 200A; Revision Date: 04/08/21; Package Reference: DO-214AA; Voltage: 10.3V
footprint DO-214AA
pins: 1 K, 2 A